# Altium footprint library LPEDT_Pulse_Project_PCB_Library.PcbLib: 34 footprints (part 1 of 3)
Each footprint in its own frame and in the unit in brackets; x right, y up, seen from the top. Pads: shape width x height; smd on the part's side, far side on the other; paste and mask are expansions set on the pad; w line width, h text height; cw(c..) or ccw(c..) is an arc to the next point about the centre after c.
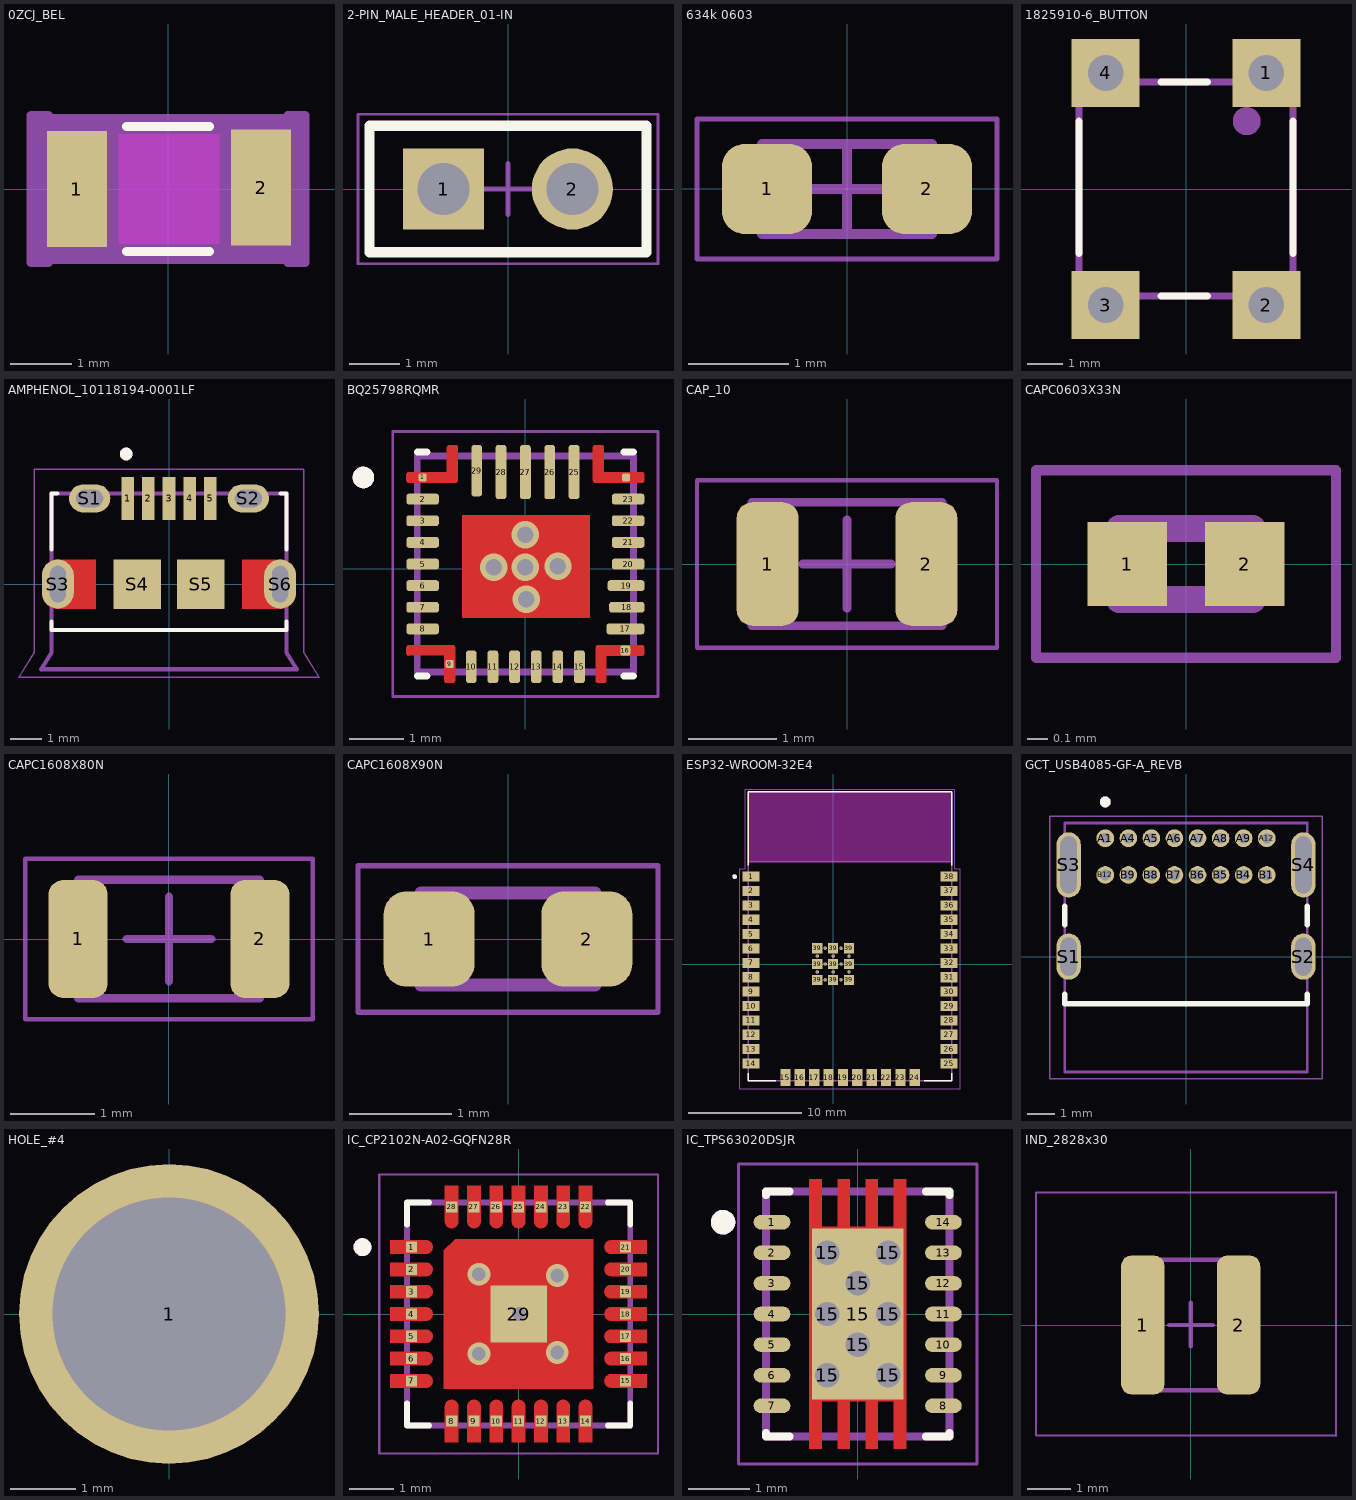
[diagram p0: the footprints below, top view; thin cyan lines are the x and y axes]

## 0ZCJ_BEL [mil]
pads (2):
  rect 39x75 smd paste+0 mask+0: 1(-59,0) 2(60.07,0.85)
Top Layer keep-out:
  region: -32,-35.5 -32,35.5 33,35.5 33,-35.5
Top Overlay:
  lines w6: -26.75,-40.5 26.75,-40.5 ; -26.75,40.5 26.75,40.5
Mechanical 13:
  lines w1: -67.5,-35.5 67.5,-35.5 67.5,35.5 -67.5,35.5 -67.5,-35.5
Mechanical 15:
  region: -77.5,-47.5 -88.5,-47.5 -88.5,47.5 -77.5,47.5 -77.5,45.5 77.5,45.5 77.5,47.5 88.5,47.5 88.5,-47.5 77.5,-47.5 77.5,-45.5 -77.5,-45.5
  region: 67.5,-35.5 -67.5,-35.5 -67.5,35.5 67.5,35.5
  lines w6: -88.5,-47.5 -88.5,47.5 -77.5,47.5 -77.5,45.5 77.5,45.5 77.5,47.5 88.5,47.5 88.5,-47.5 77.5,-47.5 77.5,-45.5 -77.5,-45.5 -77.5,-47.5 -88.5,-47.5
3D body "0ZCJ_BEL.step": height 63.11, standoff -0.12, extent -67.48,-35.59 67.48,35.59

## 2-PIN_MALE_HEADER_01-IN [mm] "Terminal Assembly, 1x2 Pins, Vertical, 2.54mm Pitch, Male"
height 6.02
pads (2):
  rect 1.6x1.6 hole 1.02: 1(-1.27,0)
  round 1.6 hole 1.02: 2(1.27,0)
Top Overlay:
  lines w0.2: -2.73,-1.245 -2.73,1.245 2.73,1.245 2.73,-1.245 -2.73,-1.245
Mechanical 13:
  lines w0.1: -2.73,1.245 -2.73,-1.245 2.73,-1.245 2.73,1.245 -2.73,1.245
  text ".Designator" at -1.524,-0.635 h1.3
Mechanical 15:
  lines w0.05: -2.955,-1.47 -2.955,1.47 2.955,1.47 2.955,-1.47 -2.955,-1.47
  lines w0.1: -0.5,0 0.5,0 ; 0,-0.5 0,0.5
3D body "User Library-Header_Male_2Pin.STEP": height 8.54, standoff -3, extent -2.54,-1.22 2.54,1.27

## 634k 0603 [mm] "Chip Resistor"
height 0.55
pads (2):
  rrect50% 0.9x0.9 smd: 1(-0.8,0) 2(0.8,0)
Mechanical 13:
  lines w0.1: -0.85,-0.45 -0.85,0.45 0.85,0.45 0.85,-0.45 -0.85,-0.45
  text ".Designator" at -0.635,-0.254 h0.4
Mechanical 15:
  lines w0.05: -1.5,-0.7 -1.5,0.7 1.5,0.7 1.5,-0.7 -1.5,-0.7
  lines w0.1: -0.45,0 0.45,0 ; 0,-0.45 0,0.45
3D body "0603_1608X05N.step": height 0.45, standoff 0, extent -0.775,-0.425 0.775,0.425

## 1825910-6_BUTTON [mm]
pads (4):
  rect 1.9x1.9 hole 1: 1(2.25,3.25) 2(2.25,-3.25) 3(-2.25,-3.25) 4(-2.25,3.25)
Top Overlay:
  lines w0.2: -3,-1.8 -3,1.9 -3,0 ; -0.7,-3 0.6,-3 ; -0.7,3 0.6,3 ; 3,-1.8 3,1.9
Mechanical 2:
  circle w0.5: c1.7,1.9 r0.141
  lines w0.2: -3,-3 -3,3 3,3 3,-3 -3,-3
3D body "FSM4JLH(1825910-5).step": height 5, standoff -3.51, extent -2.995,-3.998 2.995,3.8
3D body: height 5.11, standoff 3.61, extent -1.9,-2.097 1.9,1.697

## AMPHENOL_10118194-0001LF [mm]
pads (11):
  rect 0.4x1.35 smd mask+0.051: 1(-1.3,2.7) 2(-0.65,2.7) 3(0,2.7) 4(0.65,2.7) 5(1.3,2.7)
  oval 1.3x0.889 hole 0.55 slot 0.85 at 0 deg mask+0.102: S1(-2.5,2.7) S2(2.5,2.7)
  oval 1.003x1.55 hole 0.5 slot 1.15 at 90 deg: S3(-3.5,0) S6(3.5,0)
  rect 1.5x1.55 smd: S4(-1,0) S5(1,0)
Top Layer:
  region: 192 vertices and 0 holes, not listed, extent -4,-0.775 -2.3,0.78
  region: 192 vertices and 0 holes, not listed, extent 2.3,-0.78 4,0.775
Top Overlay:
  circle w0.2: c-1.35,4.1 r0.1
  lines w0.127: -3.7,-1.18 -3.7,-1.45 3.7,-1.45 3.7,-1.18 ; -3.7,1.095 -3.7,2.85 -3.52,2.85 ; 3.52,2.85 3.7,2.85 3.7,1.095
Top Paste:
  drawing of 6 lines, arcs and shapes, not listed
Top Solder:
  region: -2.2,-0.875 -3.6,-0.875 -3.626,-0.874 -3.652,-0.872 -3.678,-0.869 -3.704,-0.864 -3.729,-0.858 -3.755,-0.851 -3.779,-0.842 -3.803,-0.832 -3.827,-0.821 -3.85,-0.808 -3.872,-0.794 -3.894,-0.78 -3.915,-0.764 -3.935,-0.747 -3.954,-0.729 -3.972,-0.71 -3.989,-0.69 -4.005,-0.669 -4.019,-0.647 -4.033,-0.625 -4.046,-0.602 -4.057,-0.578 -4.067,-0.554 -4.076,-0.53 -4.083,-0.504 -4.089,-0.479 -4.094,-0.453 -4.097,-0.427 -4.099,-0.401 -4.1,-0.375 -4.1,0.375 -4.099,0.401 -4.097,0.427 -4.094,0.453 -4.089,0.479 -4.083,0.504 -4.076,0.53 -4.067,0.554 -4.057,0.578 -4.046,0.602 -4.033,0.625 -4.019,0.647 -4.005,0.669 -3.989,0.69 -3.972,0.71 -3.954,0.729 -3.935,0.747 -3.915,0.764 -3.894,0.78 -3.872,0.794 -3.85,0.808 -3.827,0.821 -3.803,0.832 -3.779,0.842 -3.755,0.851 -3.729,0.858 -3.704,0.864 -3.678,0.869 -3.652,0.872 -3.626,0.874 -3.6,0.875 -2.2,0.875
  region: 3.626,0.874 3.652,0.872 3.678,0.869 3.704,0.864 3.729,0.858 3.755,0.851 3.779,0.842 3.803,0.832 3.827,0.821 3.85,0.808 3.872,0.794 3.894,0.78 3.915,0.764 3.935,0.747 3.954,0.729 3.972,0.71 3.989,0.69 4.005,0.669 4.019,0.647 4.033,0.625 4.046,0.602 4.057,0.578 4.067,0.554 4.076,0.53 4.083,0.504 4.089,0.479 4.094,0.453 4.097,0.427 4.099,0.401 4.1,0.375 4.1,-0.375 4.099,-0.401 4.097,-0.427 4.094,-0.453 4.089,-0.479 4.083,-0.504 4.076,-0.53 4.067,-0.554 4.057,-0.578 4.046,-0.602 4.033,-0.625 4.019,-0.647 4.005,-0.669 3.989,-0.69 3.972,-0.71 3.954,-0.729 3.935,-0.747 3.915,-0.764 3.894,-0.78 3.872,-0.794 3.85,-0.808 3.827,-0.821 3.803,-0.832 3.779,-0.842 3.755,-0.851 3.729,-0.858 3.704,-0.864 3.678,-0.869 3.652,-0.872 3.626,-0.874 3.6,-0.875 2.2,-0.875 2.2,0.875 3.6,0.875
Mechanical 13:
  circle w0.2: c-1.35,4.1 r0.1
  lines w0.127: -3.7,-1.45 3.7,-1.45 ; -3.7,-1.45 -3.7,2.85 3.7,2.85 3.7,-1.45 ; -3.7,-1.45 -3.7,-2.15 -4.025,-2.68 4.025,-2.68 3.7,-2.15 3.7,-1.45
  text "PCB END" at -1.95,-2.1 h0.5
  text ".Designator" at -3.187,1.219 h0.5
Mechanical 15:
  lines w0.05: -4.725,-2.93 4.725,-2.93 4.25,-2.15 4.25,3.625 -4.25,3.625 -4.25,-2.15 -4.725,-2.93
3D body "10118194-0001LF--3DModel-STEP-533217COLOR.STEP": height 2.69, standoff -0.58, extent -4.025,-2.667 4.025,2.913

## BQ25798RQMR [mm]
height 1
pads (29):
  rrect50% 0.15x0.15 smd paste-1 mask+0: 1(-1.9,1.687) 9(-1.4,-1.762) 24(1.863,1.687)
  rrect50% 0.6x0.2 smd mask+0: 2(-1.9,1.288) 3(-1.9,0.888) 4(-1.9,0.487) 5(-1.9,0.088) 6(-1.9,-0.312) 7(-1.9,-0.713) 8(-1.9,-1.112) 20(1.9,0.088) 21(1.9,0.487) 22(1.9,0.888) 23(1.9,1.288)
  rrect50% 0.2x0.6 smd mask+0: 10(-1,-1.812) 11(-0.6,-1.812) 12(-0.2,-1.812) 13(0.2,-1.812) 14(0.6,-1.812) 15(1,-1.812)
  rrect50% 0.19x0.19 smd paste-1 mask+0: 16(1.85,-1.512)
  rrect50% 0.7x0.2 smd mask+0: 17(1.85,-1.112)
  rrect50% 0.65x0.2 smd mask+0: 18(1.875,-0.713)
  rrect50% 0.68x0.2 smd mask+0: 19(1.863,-0.312)
  rrect50% 0.2x1 smd mask+0: 25(0.9,1.787) 26(0.45,1.787) 27(0,1.787) 28(-0.45,1.787)
  rrect50% 0.2x0.95 smd mask+0: 29(-0.9,1.813)
via -0.584,0.025 diameter 0.508 hole 0.305
via 0.603,0.043 diameter 0.508 hole 0.305
via -0.007,0.627 diameter 0.508 hole 0.305
via 0,0.025 diameter 0.508 hole 0.305
via 0.019,-0.567 diameter 0.508 hole 0.305
Top Layer:
  rectangle: -1.168,-0.914 1.194,0.991
  region: 2.158,-1.413 2.16,-1.413 2.163,-1.415 2.165,-1.415 2.168,-1.415 2.17,-1.416 2.173,-1.418 2.175,-1.419 2.177,-1.421 2.179,-1.422 2.181,-1.423 2.183,-1.425 2.185,-1.428 2.187,-1.429 2.189,-1.431 2.19,-1.433 2.192,-1.435 2.193,-1.438 2.195,-1.439 2.196,-1.442 2.197,-1.445 2.198,-1.448 2.198,-1.449 2.199,-1.452 2.199,-1.455 2.2,-1.458 2.2,-1.459 2.2,-1.462 2.2,-1.562 2.2,-1.565 2.2,-1.568 2.199,-1.57 2.199,-1.572 2.198,-1.575 2.198,-1.578 2.197,-1.58 2.196,-1.582 2.195,-1.585 2.193,-1.587 2.192,-1.589 2.19,-1.592 2.189,-1.593 2.187,-1.595 2.185,-1.597 2.183,-1.599 2.181,-1.602 2.179,-1.602 2.177,-1.605 2.175,-1.605 2.173,-1.607 2.17,-1.609 2.168,-1.609 2.165,-1.61 2.163,-1.61 2.16,-1.612 2.158,-1.612 2.155,-1.612 1.5,-1.612 1.5,-2.063 1.5,-2.066 1.5,-2.067 1.499,-2.07 1.499,-2.073 1.498,-2.076 1.498,-2.077 1.497,-2.08 1.496,-2.083 1.495,-2.086 1.493,-2.087 1.492,-2.09 1.49,-2.091 1.489,-2.093 1.487,-2.095 1.485,-2.097 1.483,-2.1 1.481,-2.101 1.479,-2.103 1.477,-2.104 1.475,-2.105 1.473,-2.107 1.47,-2.108 1.468,-2.11 1.465,-2.11 1.463,-2.11 1.46,-2.111 1.458,-2.111 1.455,-2.113 1.345,-2.113 1.342,-2.111 1.34,-2.111 1.337,-2.11 1.335,-2.11 1.332,-2.11 1.33,-2.108 1.327,-2.107 1.325,-2.105 1.323,-2.104 1.321,-2.103 1.319,-2.101 1.317,-2.1 1.315,-2.097 1.313,-2.095 1.311,-2.093 1.31,-2.091 1.308,-2.09 1.307,-2.087 1.305,-2.086 1.304,-2.083 1.303,-2.08 1.302,-2.077 1.302,-2.076 1.301,-2.073 1.301,-2.07 1.3,-2.067 1.3,-2.066 1.3,-2.063 1.3,-1.462 1.3,-1.459 1.3,-1.458 1.301,-1.455 1.301,-1.452 1.302,-1.449 1.302,-1.448 1.303,-1.445 1.304,-1.442 1.305,-1.439 1.307,-1.438 1.308,-1.435 1.31,-1.433 1.311,-1.431 1.313,-1.429 1.315,-1.428 1.317,-1.425 1.319,-1.423 1.321,-1.422 1.323,-1.421 1.325,-1.419 1.327,-1.418 1.33,-1.416 1.332,-1.415 1.335,-1.415 1.337,-1.415 1.34,-1.413 1.342,-1.413 1.345,-1.412 2.155,-1.412
  region: -1.342,-1.413 -1.34,-1.413 -1.337,-1.415 -1.335,-1.415 -1.332,-1.415 -1.33,-1.416 -1.327,-1.418 -1.325,-1.419 -1.323,-1.421 -1.321,-1.422 -1.319,-1.423 -1.317,-1.425 -1.315,-1.428 -1.313,-1.429 -1.311,-1.431 -1.31,-1.433 -1.308,-1.435 -1.307,-1.438 -1.305,-1.439 -1.304,-1.442 -1.303,-1.445 -1.302,-1.448 -1.302,-1.449 -1.301,-1.452 -1.301,-1.455 -1.3,-1.458 -1.3,-1.459 -1.3,-1.462 -1.3,-2.063 -1.3,-2.066 -1.3,-2.067 -1.301,-2.07 -1.301,-2.073 -1.302,-2.076 -1.302,-2.077 -1.303,-2.08 -1.304,-2.083 -1.305,-2.086 -1.307,-2.087 -1.308,-2.09 -1.31,-2.091 -1.311,-2.093 -1.313,-2.095 -1.315,-2.097 -1.317,-2.1 -1.319,-2.101 -1.321,-2.103 -1.323,-2.104 -1.325,-2.105 -1.327,-2.107 -1.33,-2.108 -1.332,-2.11 -1.335,-2.11 -1.337,-2.11 -1.34,-2.111 -1.342,-2.111 -1.345,-2.113 -1.455,-2.113 -1.458,-2.111 -1.46,-2.111 -1.463,-2.11 -1.465,-2.11 -1.468,-2.11 -1.47,-2.108 -1.473,-2.107 -1.475,-2.105 -1.477,-2.104 -1.479,-2.103 -1.481,-2.101 -1.483,-2.1 -1.485,-2.097 -1.487,-2.095 -1.489,-2.093 -1.49,-2.091 -1.492,-2.09 -1.493,-2.087 -1.495,-2.086 -1.496,-2.083 -1.497,-2.08 -1.498,-2.077 -1.498,-2.076 -1.499,-2.073 -1.499,-2.07 -1.5,-2.067 -1.5,-2.066 -1.5,-2.063 -1.5,-1.612 -2.155,-1.612 -2.158,-1.612 -2.16,-1.612 -2.163,-1.61 -2.165,-1.61 -2.168,-1.609 -2.17,-1.609 -2.173,-1.607 -2.175,-1.605 -2.177,-1.605 -2.179,-1.602 -2.181,-1.602 -2.183,-1.599 -2.185,-1.597 -2.187,-1.595 -2.189,-1.593 -2.19,-1.592 -2.192,-1.589 -2.193,-1.587 -2.195,-1.585 -2.196,-1.582 -2.197,-1.58 -2.198,-1.578 -2.198,-1.575 -2.199,-1.572 -2.199,-1.57 -2.2,-1.568 -2.2,-1.565 -2.2,-1.562 -2.2,-1.462 -2.2,-1.459 -2.2,-1.458 -2.199,-1.455 -2.199,-1.452 -2.198,-1.449 -2.198,-1.448 -2.197,-1.445 -2.196,-1.442 -2.195,-1.439 -2.193,-1.438 -2.192,-1.435 -2.19,-1.433 -2.189,-1.431 -2.187,-1.429 -2.185,-1.428 -2.183,-1.425 -2.181,-1.423 -2.179,-1.422 -2.177,-1.421 -2.175,-1.419 -2.173,-1.418 -2.17,-1.416 -2.168,-1.415 -2.165,-1.415 -2.163,-1.415 -2.16,-1.413 -2.158,-1.413 -2.155,-1.412 -1.345,-1.412
  region: 1.408,2.287 1.41,2.287 1.413,2.285 1.415,2.285 1.418,2.285 1.42,2.284 1.423,2.282 1.425,2.281 1.427,2.28 1.429,2.278 1.431,2.277 1.433,2.275 1.435,2.272 1.437,2.271 1.439,2.268 1.44,2.267 1.442,2.265 1.443,2.262 1.445,2.261 1.446,2.258 1.447,2.255 1.448,2.252 1.448,2.251 1.449,2.248 1.449,2.245 1.45,2.242 1.45,2.241 1.45,2.238 1.45,1.787 2.155,1.787 2.158,1.787 2.16,1.787 2.163,1.786 2.165,1.786 2.168,1.784 2.17,1.784 2.173,1.783 2.175,1.78 2.177,1.78 2.179,1.777 2.181,1.777 2.183,1.774 2.185,1.773 2.187,1.77 2.189,1.769 2.19,1.767 2.192,1.764 2.193,1.763 2.195,1.76 2.196,1.757 2.197,1.756 2.198,1.753 2.198,1.75 2.199,1.747 2.199,1.746 2.2,1.743 2.2,1.74 2.2,1.737 2.2,1.637 2.2,1.635 2.2,1.633 2.199,1.63 2.199,1.627 2.198,1.625 2.198,1.623 2.197,1.62 2.196,1.617 2.195,1.615 2.193,1.613 2.192,1.61 2.19,1.609 2.189,1.606 2.187,1.605 2.185,1.603 2.183,1.6 2.181,1.599 2.179,1.597 2.177,1.596 2.175,1.595 2.173,1.593 2.17,1.592 2.168,1.59 2.165,1.59 2.163,1.59 2.16,1.589 2.158,1.589 2.155,1.587 1.295,1.587 1.292,1.589 1.29,1.589 1.287,1.59 1.285,1.59 1.282,1.59 1.28,1.592 1.277,1.593 1.275,1.595 1.273,1.596 1.271,1.597 1.269,1.599 1.267,1.6 1.265,1.603 1.263,1.605 1.261,1.606 1.26,1.609 1.258,1.61 1.257,1.613 1.255,1.615 1.254,1.617 1.253,1.62 1.252,1.623 1.252,1.625 1.251,1.627 1.251,1.63 1.25,1.633 1.25,1.635 1.25,1.637 1.25,2.238 1.25,2.241 1.25,2.242 1.251,2.245 1.251,2.248 1.252,2.251 1.252,2.252 1.253,2.255 1.254,2.258 1.255,2.261 1.257,2.262 1.258,2.265 1.26,2.267 1.261,2.268 1.263,2.271 1.265,2.272 1.267,2.275 1.269,2.277 1.271,2.278 1.273,2.28 1.275,2.281 1.277,2.282 1.28,2.284 1.282,2.285 1.285,2.285 1.287,2.285 1.29,2.287 1.292,2.287 1.295,2.288 1.405,2.288
  region: -1.292,2.287 -1.29,2.287 -1.287,2.285 -1.285,2.285 -1.282,2.285 -1.28,2.284 -1.277,2.282 -1.275,2.281 -1.273,2.28 -1.271,2.278 -1.269,2.277 -1.267,2.275 -1.265,2.272 -1.263,2.271 -1.261,2.268 -1.26,2.267 -1.258,2.265 -1.257,2.262 -1.255,2.261 -1.254,2.258 -1.253,2.255 -1.252,2.252 -1.252,2.251 -1.251,2.248 -1.251,2.245 -1.25,2.242 -1.25,2.241 -1.25,2.238 -1.25,1.637 -1.25,1.635 -1.25,1.633 -1.251,1.63 -1.251,1.627 -1.252,1.625 -1.252,1.623 -1.253,1.62 -1.254,1.617 -1.255,1.615 -1.257,1.613 -1.258,1.61 -1.26,1.609 -1.261,1.606 -1.263,1.605 -1.265,1.603 -1.267,1.6 -1.269,1.599 -1.271,1.597 -1.273,1.596 -1.275,1.595 -1.277,1.593 -1.28,1.592 -1.282,1.59 -1.285,1.59 -1.287,1.59 -1.29,1.589 -1.292,1.589 -1.295,1.587 -2.155,1.587 -2.158,1.589 -2.16,1.589 -2.163,1.59 -2.165,1.59 -2.168,1.59 -2.17,1.592 -2.173,1.593 -2.175,1.595 -2.177,1.596 -2.179,1.597 -2.181,1.599 -2.183,1.6 -2.185,1.603 -2.187,1.605 -2.189,1.606 -2.19,1.609 -2.192,1.61 -2.193,1.613 -2.195,1.615 -2.196,1.617 -2.197,1.62 -2.198,1.623 -2.198,1.625 -2.199,1.627 -2.199,1.63 -2.2,1.633 -2.2,1.635 -2.2,1.637 -2.2,1.737 -2.2,1.74 -2.2,1.743 -2.199,1.746 -2.199,1.747 -2.198,1.75 -2.198,1.753 -2.197,1.756 -2.196,1.757 -2.195,1.76 -2.193,1.763 -2.192,1.764 -2.19,1.767 -2.189,1.769 -2.187,1.77 -2.185,1.773 -2.183,1.774 -2.181,1.777 -2.179,1.777 -2.177,1.78 -2.175,1.78 -2.173,1.783 -2.17,1.784 -2.168,1.784 -2.165,1.786 -2.163,1.786 -2.16,1.787 -2.158,1.787 -2.155,1.787 -1.45,1.787 -1.45,2.238 -1.45,2.241 -1.45,2.242 -1.449,2.245 -1.449,2.248 -1.448,2.251 -1.448,2.252 -1.447,2.255 -1.446,2.258 -1.445,2.261 -1.443,2.262 -1.442,2.265 -1.44,2.267 -1.439,2.268 -1.437,2.271 -1.435,2.272 -1.433,2.275 -1.431,2.277 -1.429,2.278 -1.427,2.28 -1.425,2.281 -1.423,2.282 -1.42,2.284 -1.418,2.285 -1.415,2.285 -1.413,2.285 -1.41,2.287 -1.408,2.287 -1.405,2.288 -1.295,2.288
Top Overlay:
  circle w0.2: c-2.995,1.687 r0.1
  lines w0.127: -2,-1.983 -1.82,-1.983 ; -2,2.158 -1.82,2.158 ; 1.82,-1.983 2,-1.983 ; 1.82,2.158 2,2.158
Top Paste:
  drawing of 4 lines, arcs and shapes, not listed
Top Solder:
  drawing of 29 lines, arcs and shapes, not listed
Mechanical 1:
  text ".Designator" at -1.805,-1.58 h0.75
Mechanical 13:
  circle w0.2: c-2.995,1.687 r0.1
  lines w0.127: -2,-1.913 -2,2.088 2,2.088 2,-1.913 -2,-1.913
Mechanical 15:
  lines w0.05: -2.45,-2.362 2.453,-2.362 2.453,2.538 -2.45,2.538 -2.45,-2.362
3D body "step_temp.STEP": height 1, standoff 0, extent -2,-1.913 2,2.088

## CAP_10 [mm] "Chip Capacitor, 2-Leads, Body 2.00x1.25mm, IPC Medium Density"
height 1.4
pads (2):
  rrect50% 0.7x1.4 smd: 1(-0.9,0) 2(0.9,0)
Mechanical 1:
  text ".Designator" at -0.955,-0.447 h0.4
Mechanical 13:
  lines w0.1: -1.075,-0.7 1.075,-0.7 1.075,0.7 -1.075,0.7 -1.075,-0.7
Mechanical 15:
  lines w0.05: -1.7,-0.95 1.7,-0.95 1.7,0.95 -1.7,0.95 -1.7,-0.95
  lines w0.1: -0.5,0 0.5,0 ; 0,-0.5 0,0.5
3D body: height 1.4, standoff 0, extent 0.625,-0.7 1.075,0.7
3D body: height 1.4, standoff 0, extent -1.075,-0.7 -0.625,0.7
3D body: height 1.4, standoff 0, extent -0.625,-0.7 0.625,0.7

## CAPC0603X33N [mm]
pads (2):
  rect 0.38x0.4 smd: 1(-0.281,0) 2(0.281,0)
Mechanical 13:
  lines w0.127: -0.32,-0.17 -0.32,0.17 0.32,0.17 0.32,-0.17 -0.32,-0.17
Mechanical 15:
  lines w0.05: -0.718,-0.448 -0.718,0.448 0.718,0.448 0.718,-0.448 -0.718,-0.448
3D body "step_temp.STEP": height 0.33, standoff 0, extent -0.3,-0.15 0.3,0.15

## CAPC1608X80N [mm]
pads (2):
  rrect50% 0.7x1.4 smd: 1(-1.075,0) 2(1.075,0)
Mechanical 1:
  text ".Designator" at -0.955,-0.447 h0.4
Mechanical 13:
  lines w0.1: -1.075,-0.7 -1.075,0.7 1.075,0.7 1.075,-0.7 -1.075,-0.7
Mechanical 15:
  lines w0.05: -1.7,-0.95 -1.7,0.95 1.7,0.95 1.7,-0.95 -1.7,-0.95
  lines w0.1: -0.5,0 0.5,0 ; 0,-0.5 0,0.5
3D body: height 1.4, standoff 0, extent -0.625,-0.7 0.625,0.7
3D body: height 1.4, standoff 0, extent -1.075,-0.7 -0.625,0.7
3D body: height 1.4, standoff 0, extent 0.625,-0.7 1.075,0.7

## CAPC1608X90N [mm]
pads (2):
  rrect50% 0.89x0.93 smd: 1(-0.77,0) 2(0.77,0)
Mechanical 13:
  lines w0.127: -0.85,-0.45 -0.85,0.45 0.85,0.45 0.85,-0.45 -0.85,-0.45
Mechanical 15:
  lines w0.05: -1.465,-0.715 -1.465,0.715 1.465,0.715 1.465,-0.715 -1.465,-0.715
3D body "step_temp.STEP": height 0.9, standoff 0, extent -0.8,-0.4 0.8,0.4

## ESP32-WROOM-32E4 [mm]
height 3.25
pads (59):
  rect 1.5x0.9 smd: 1(-7.25,7.72) 2(-7.25,6.45) 3(-7.25,5.18) 4(-7.25,3.91) 5(-7.25,2.64) 6(-7.25,1.37) 7(-7.25,0.1) 8(-7.25,-1.17) 9(-7.25,-2.44) 10(-7.25,-3.71) 11(-7.25,-4.98) 12(-7.25,-6.25) 13(-7.25,-7.52) 14(-7.25,-8.79) 25(10.25,-8.79) 26(10.25,-7.52) 27(10.25,-6.25) 28(10.25,-4.98) 29(10.25,-3.71) 30(10.25,-2.44) 31(10.25,-1.17) 32(10.25,0.1) 33(10.25,1.37) 34(10.25,2.64) 35(10.25,3.91) 36(10.25,5.18) 37(10.25,6.45) 38(10.25,7.72)
  rect 0.9x1.5 smd: 15(-4.215,-10.04) 16(-2.945,-10.04) 17(-1.675,-10.04) 18(-0.405,-10.04) 19(0.865,-10.04) 20(2.135,-10.04) 21(3.405,-10.04) 22(4.675,-10.04) 23(5.945,-10.04) 24(7.215,-10.04)
  rect 0.9x0.9 smd: 39(-1.4,-1.4) 39(-1.4,0) 39(-1.4,1.4) 39(0,-1.4) 39(0,0) 39(0,1.4) 39(1.4,-1.4) 39(1.4,0) 39(1.4,1.4)
  round 0.3 hole 0.2 mask+0: 39(-1.4,-0.7) 39(-1.4,0.7) 39(-0.7,-1.4) 39(-0.7,0) 39(-0.7,1.4) 39(0,-0.7) 39(0,0.7) 39(0.7,-1.4) 39(0.7,0) 39(0.7,1.4) 39(1.4,-0.7) 39(1.4,0.7)
Top Overlay:
  circle w0.2: c-8.7,7.72 r0.1
  lines w0.127: -7.5,-9.64 -7.5,-10.29 -5.05,-10.29 ; -7.5,8.71 -7.5,15.21 10.5,15.21 10.5,8.71 ; 8.05,-10.29 10.5,-10.29 10.5,-9.64
Keep-Out Layer:
  region: 10.5,9.02 -7.5,9.02 -7.5,15.21 10.5,15.21
Mechanical 13:
  circle w0.2: c-8.7,7.72 r0.1
  lines w0.127: -7.5,9.02 -7.5,-10.29 10.5,-10.29 10.5,9.02 ; -7.5,9.02 -7.5,15.21 10.5,15.21 10.5,9.02 ; -7.5,9.02 10.5,9.02
  text "ANTENNA" at -4.5,11.46 h1.78
  text ".Designator" at -5.994,-9.093 h1.52
Mechanical 15:
  lines w0.05: -8.25,-11.04 11.25,-11.04 11.25,8.42 10.75,8.42 10.75,15.46 -7.75,15.46 -7.75,13.7 -7.75,10.18 -7.75,8.42 -8.25,8.42 -8.25,-11.04
3D body "step_temp.STEP": height 3.25, standoff 0, extent -7.5,-10.29 10.5,15.21

## GCT_USB4085-GF-A_REVB [mm]
height 3.16
pads (20):
  round 0.65 hole 0.4: A1(-2.975,4.36) A4(-2.125,4.36) A5(-1.275,4.36) A6(-0.425,4.36) A7(0.425,4.36) A8(1.275,4.36) A9(2.125,4.36) A12(2.975,4.36) B1(2.975,3.01) B4(2.125,3.01) B5(1.275,3.01) B6(0.425,3.01) B7(-0.425,3.01) B8(-1.275,3.01) B9(-2.125,3.01) B12(-2.975,3.01)
  oval 0.9x1.7 hole 0.6 slot 1.4 at 90 deg: S1(-4.325,0) S2(4.325,0)
  oval 0.9x2.4 hole 0.6 slot 2.1 at 90 deg: S3(-4.325,3.38) S4(4.325,3.38)
Top Overlay:
  circle w0.2: c-2.975,5.7 r0.1
  lines w0.2: -4.47,-1.39 -4.47,-1.74 4.47,-1.74 4.47,-1.39 ; -4.47,1.17 -4.47,1.85 ; 4.47,1.17 4.47,1.85
Mechanical 13:
  circle w0.2: c-2.975,5.7 r0.1
  lines w0.1: 4.445,-1.74 -4.47,-1.74 ; -4.47,-1.74 -4.47,4.92 4.47,4.92 4.47,-4.25 -4.47,-4.25 -4.47,-1.74
Mechanical 15:
  lines w0.05: -5.025,-4.5 -5.025,5.17 5.025,5.17 5.025,-4.5 -5.025,-4.5
3D body "step_temp.STEP": height 3.46, standoff -2.1, extent -4.47,-4.25 4.47,4.92

## HOLE_#4 [mil]
pads (1):
  round 180 hole 140: 1(0,0)

## IC_CP2102N-A02-GQFN28R [mm]
height 0.8
pads (29):
  rect 0.25x0.25 smd paste-1 mask+0: 1(-2.4,1.5) 2(-2.4,1) 3(-2.4,0.5) 4(-2.4,0) 5(-2.4,-0.5) 6(-2.4,-1) 7(-2.4,-1.5) 8(-1.5,-2.4) 9(-1,-2.4) 10(-0.5,-2.4) 11(0,-2.4) 12(0.5,-2.4) 13(1,-2.4) 14(1.5,-2.4) 15(2.4,-1.5) 16(2.4,-1) 17(2.4,-0.5) 18(2.4,0) 19(2.4,0.5) 20(2.4,1) 21(2.4,1.5) 22(1.5,2.4) 23(1,2.4) 24(0.5,2.4) 25(0,2.4) 26(-0.5,2.4) 27(-1,2.4) 28(-1.5,2.4)
  rect 1.27x1.27 smd paste+0.424 mask+0: 29(0,0)
via -0.889,0.889 diameter 0.508 hole 0.305
via 0.864,0.864 diameter 0.508 hole 0.305
via -0.889,-0.889 diameter 0.508 hole 0.305
via 0.864,-0.864 diameter 0.508 hole 0.305
via 0,0 diameter 0.508 hole 0.305
Top Layer:
  drawing of 29 lines, arcs and shapes, not listed
Top Overlay:
  circle w0.2: c-3.5,1.5 r0.1
  lines w0.127: -2.5,-2 -2.5,-2.5 -2,-2.5 ; -2.5,2 -2.5,2.5 -2,2.5 ; 2,-2.5 2.5,-2.5 2.5,-2 ; 2,2.5 2.5,2.5 2.5,2
Top Paste:
  drawing of 28 lines, arcs and shapes, not listed
Top Solder:
  drawing of 29 lines, arcs and shapes, not listed
Mechanical 13:
  circle w0.2: c-3.5,1.5 r0.1
  lines w0.127: -2.5,-2.5 2.5,-2.5 2.5,2.5 -2.5,2.5 -2.5,-2.5
Mechanical 15:
  lines w0.05: -3.125,-3.125 3.125,-3.125 3.125,3.125 -3.125,3.125 -3.125,-3.125
3D body "step_temp.STEP": height 0.8, standoff 0, extent -2.5,-2.5 2.5,2.5

## IC_TPS63020DSJR [mm]
pads (23):
  oval 0.6x0.24 smd mask+0: 1(-1.4,1.5) 2(-1.4,1) 3(-1.4,0.5) 4(-1.4,0) 5(-1.4,-0.5) 6(-1.4,-1) 7(-1.4,-1.5) 8(1.4,-1.5) 9(1.4,-1) 10(1.4,-0.5) 11(1.4,0) 12(1.4,0.5) 13(1.4,1) 14(1.4,1.5)
  round 0.5 hole 0.4 mask+0.102: 15(-0.5,-1) 15(-0.5,0) 15(-0.5,1) 15(0,-0.5) 15(0,0.5) 15(0.5,-1) 15(0.5,0) 15(0.5,1)
  rect 1.5x2.8 smd paste-2 mask+0: 15(0,0)
Top Layer:
  region: 0.79,-2.2 0.59,-2.2 0.59,-1.425 0.33,-1.425 0.33,-2.2 0.13,-2.2 0.13,-1.425 -0.13,-1.425 -0.13,-2.2 -0.33,-2.2 -0.33,-1.425 -0.59,-1.425 -0.59,-2.2 -0.79,-2.2 -0.79,2.2 -0.59,2.2 -0.59,1.425 -0.33,1.425 -0.33,2.2 -0.13,2.2 -0.13,1.425 0.13,1.425 0.13,2.2 0.33,2.2 0.33,1.425 0.59,1.425 0.59,2.2 0.79,2.2
Top Overlay:
  circle w0.2: c-2.2,1.5 r0.1
  lines w0.127: -1.5,-1.94 -1.5,-2 -1.11,-2 ; -1.5,1.94 -1.5,2 -1.11,2 ; 1.11,-2 1.5,-2 1.5,-1.94 ; 1.11,2 1.5,2 1.5,1.94
Top Paste:
  region: 0.79,0.1 0.13,0.1 0.13,2.2 0.33,2.2 0.33,1.35 0.59,1.35 0.59,2.2 0.79,2.2
  region: 0.79,-2.2 0.59,-2.2 0.59,-1.35 0.33,-1.35 0.33,-2.2 0.13,-2.2 0.13,-0.1 0.79,-0.1
  region: -0.13,-2.2 -0.33,-2.2 -0.33,-1.35 -0.59,-1.35 -0.59,-2.2 -0.79,-2.2 -0.79,-0.1 -0.13,-0.1
Top Solder:
  drawing of 15 lines, arcs and shapes, not listed
Mechanical 13:
  circle w0.2: c-2.2,1.5 r0.1
  lines w0.127: -1.5,-2 1.5,-2 1.5,2 -1.5,2 -1.5,-2
Mechanical 15:
  lines w0.05: -1.95,-2.45 1.95,-2.45 1.95,2.45 -1.95,2.45 -1.95,-2.45
3D body "step_temp.STEP": height 1, standoff 0, extent -1.5,-2 1.5,2

## IND_2828x30 [mm] "Precision Wire Wound Inductor, 2-Leads, Body 2.80x2.80mm, IPC Medium Density"
height 3
pads (2):
  rrect50% 1x3.2 smd: 1(-1.1,0) 2(1.1,0)
Mechanical 13:
  lines w0.1: -1.5,-1.5 -1.5,1.5 1.5,1.5 1.5,-1.5 -1.5,-1.5
  text ".Designator" at -1.22,-0.977 h0.9
Mechanical 15:
  lines w0.05: 3.329,3.048 -3.556,3.048 -3.556,-2.54 3.341,-2.54 ; 3.341,-2.546 3.341,3.052
  lines w0.1: -0.492,0 0.508,0 ; 0,-0.492 0,0.508
3D body "WE-TPC_2828+(rev1).stp": height 2.8, standoff 0, extent -1.4,-1.4 1.4,1.4